# Altium footprint library 13-IC Packages-1bga.PcbLib: 97 footprints (part 5 of 14) (continued)
## BGA376C100P22X22_2300X2300X248 [mm] "BGA 1mm Pitch, Square, 376 pin, 22 Columns x 22 Rows, 23.0mm x 23.0mm" (continued)
  round 1 smd paste-0.51 mask+0.5: FTG1(-13.5,-13.5) FTG2(13.5,13.5)
Top Layer keep-out:
  circle w0.1: c13.5,13.5 r1
  circle w0.1: c-13.5,-13.5 r1
Top Overlay:
  circle w0.25: c-12.125,11.5 r0.125
  region: -10.5,11.5 -11.5,10.5 -11.5,11.5
  lines w0.2: -11.5,10.5 -10.5,11.5 ; -11.5,-11.5 -11.5,11.5 11.5,11.5 11.5,-11.5 -11.5,-11.5
Mechanical 14:
  circle w0.25: c-12.125,11.5 r0.125
  region: -10.5,11.5 -11.5,10.5 -11.5,11.5
  lines w0.1: -11.5,-11.5 11.5,-11.5 11.5,11.5 -11.5,11.5 -11.5,-11.5
  text "AB" at -12.9,-10.8 h0.6
  text "AA" at -12.9,-9.8 h0.6
  text "Y" at -12.4,-8.8 h0.6
  text "W" at -12.4,-7.8 h0.6
  text "V" at -12.4,-6.8 h0.6
  text "U" at -12.4,-5.8 h0.6
  text "T" at -12.4,-4.8 h0.6
  text "R" at -12.4,-3.8 h0.6
  text "P" at -12.4,-2.8 h0.6
  text "N" at -12.4,-1.8 h0.6
  text "M" at -12.4,-0.8 h0.6
  text "L" at -12.4,0.2 h0.6
  text "K" at -12.4,1.2 h0.6
  text "J" at -12.4,2.2 h0.6
  text "H" at -12.4,3.2 h0.6
  text "G" at -12.4,4.2 h0.6
  text "F" at -12.4,5.2 h0.6
  text "E" at -12.4,6.2 h0.6
  text "D" at -12.4,7.2 h0.6
  text "C" at -12.4,8.2 h0.6
  text "B" at -12.4,9.2 h0.6
  text "A" at -12.4,10.2 h0.6
  text "2" at -9.25,12 h0.6
  text "3" at -8.25,12 h0.6
  text "4" at -7.25,12 h0.6
  text "5" at -6.25,12 h0.6
  text "16" at 4.75,12 h0.6
  text "15" at 3.75,12 h0.6
  text "14" at 2.75,12 h0.6
  text "13" at 1.75,12 h0.6
  text "12" at 0.75,12 h0.6
  text "11" at -0.25,12 h0.6
  text "10" at -1.25,12 h0.6
  text "9" at -2.25,12 h0.6
  text "8" at -3.25,12 h0.6
  text "7" at -4.25,12 h0.6
  text "6" at -5.25,12 h0.6
  text "1" at -10.25,12 h0.6
  text "18" at 6.75,12 h0.6
  text "19" at 7.75,12 h0.6
  text "20" at 8.75,12 h0.6
  text "21" at 9.75,12 h0.6
  text "22" at 10.7,12 h0.6
  text "17" at 5.75,12 h0.6
Mechanical 15:
  lines w0.05: -0.5,0 0.5,0 ; 0,-0.5 0,0.5 ; -13.5,-13.5 -13.5,13.5 13.5,13.5 13.5,-13.5 -13.5,-13.5
3D body "BGA376C100P22X22_2300X2300X248.stp": height 2.48, standoff 0, extent -11.6,-11.6 11.6,11.6

## BGA400C100P20X20_2100X2100X243 [mm] "BGA, 1.00mm pitch, square, 400 pin, 20 columns X 20 rows,21.00mm X 21.00mm X 2.43mm H, IPC Medium Density"
height 2.43
pads (402):
  round 0.5 smd: A1(-9.5,9.5) A2(-8.5,9.5) A3(-7.5,9.5) A4(-6.5,9.5) A5(-5.5,9.5) A6(-4.5,9.5) A7(-3.5,9.5) A8(-2.5,9.5) A9(-1.5,9.5) A10(-0.5,9.5) A11(0.5,9.5) A12(1.5,9.5) A13(2.5,9.5) A14(3.5,9.5) A15(4.5,9.5) A16(5.5,9.5) A17(6.5,9.5) A18(7.5,9.5) A19(8.5,9.5) A20(9.5,9.5) B1(-9.5,8.5) B2(-8.5,8.5) B3(-7.5,8.5) B4(-6.5,8.5) B5(-5.5,8.5) B6(-4.5,8.5) B7(-3.5,8.5) B8(-2.5,8.5) B9(-1.5,8.5) B10(-0.5,8.5) B11(0.5,8.5) B12(1.5,8.5) B13(2.5,8.5) B14(3.5,8.5) B15(4.5,8.5) B16(5.5,8.5) B17(6.5,8.5) B18(7.5,8.5) B19(8.5,8.5) B20(9.5,8.5) C1(-9.5,7.5) C2(-8.5,7.5) C3(-7.5,7.5) C4(-6.5,7.5) C5(-5.5,7.5) C6(-4.5,7.5) C7(-3.5,7.5) C8(-2.5,7.5) C9(-1.5,7.5) C10(-0.5,7.5) C11(0.5,7.5) C12(1.5,7.5) C13(2.5,7.5) C14(3.5,7.5) C15(4.5,7.5) C16(5.5,7.5) C17(6.5,7.5) C18(7.5,7.5) C19(8.5,7.5) C20(9.5,7.5) D1(-9.5,6.5) D2(-8.5,6.5) D3(-7.5,6.5) D4(-6.5,6.5) D5(-5.5,6.5) D6(-4.5,6.5) D7(-3.5,6.5) D8(-2.5,6.5) D9(-1.5,6.5) D10(-0.5,6.5) D11(0.5,6.5) D12(1.5,6.5) D13(2.5,6.5) D14(3.5,6.5) D15(4.5,6.5) D16(5.5,6.5) D17(6.5,6.5) D18(7.5,6.5) D19(8.5,6.5) D20(9.5,6.5) E1(-9.5,5.5) E2(-8.5,5.5) E3(-7.5,5.5) E4(-6.5,5.5) E5(-5.5,5.5) E6(-4.5,5.5) E7(-3.5,5.5) E8(-2.5,5.5) E9(-1.5,5.5) E10(-0.5,5.5) E11(0.5,5.5) E12(1.5,5.5) E13(2.5,5.5) E14(3.5,5.5) E15(4.5,5.5) E16(5.5,5.5) E17(6.5,5.5) E18(7.5,5.5) E19(8.5,5.5) E20(9.5,5.5) F1(-9.5,4.5) F2(-8.5,4.5) F3(-7.5,4.5) F4(-6.5,4.5) F5(-5.5,4.5) F6(-4.5,4.5) F7(-3.5,4.5) F8(-2.5,4.5) F9(-1.5,4.5) F10(-0.5,4.5) F11(0.5,4.5) F12(1.5,4.5) F13(2.5,4.5) F14(3.5,4.5) F15(4.5,4.5) F16(5.5,4.5) F17(6.5,4.5) F18(7.5,4.5) F19(8.5,4.5) F20(9.5,4.5) G1(-9.5,3.5) G2(-8.5,3.5) G3(-7.5,3.5) G4(-6.5,3.5) G5(-5.5,3.5) G6(-4.5,3.5) G7(-3.5,3.5) G8(-2.5,3.5) G9(-1.5,3.5) G10(-0.5,3.5) G11(0.5,3.5) G12(1.5,3.5) G13(2.5,3.5) G14(3.5,3.5) G15(4.5,3.5) G16(5.5,3.5) G17(6.5,3.5) G18(7.5,3.5) G19(8.5,3.5) G20(9.5,3.5) H1(-9.5,2.5) H2(-8.5,2.5) H3(-7.5,2.5) H4(-6.5,2.5) H5(-5.5,2.5) H6(-4.5,2.5) H7(-3.5,2.5) H8(-2.5,2.5) H9(-1.5,2.5) H10(-0.5,2.5) H11(0.5,2.5) H12(1.5,2.5) H13(2.5,2.5) H14(3.5,2.5) H15(4.5,2.5) H16(5.5,2.5) H17(6.5,2.5) H18(7.5,2.5) H19(8.5,2.5) H20(9.5,2.5) J1(-9.5,1.5) J2(-8.5,1.5) J3(-7.5,1.5) J4(-6.5,1.5) J5(-5.5,1.5) J6(-4.5,1.5) J7(-3.5,1.5) J8(-2.5,1.5) J9(-1.5,1.5) J10(-0.5,1.5) J11(0.5,1.5) J12(1.5,1.5) J13(2.5,1.5) J14(3.5,1.5) J15(4.5,1.5) J16(5.5,1.5) J17(6.5,1.5) J18(7.5,1.5) J19(8.5,1.5) J20(9.5,1.5) K1(-9.5,0.5) K2(-8.5,0.5) K3(-7.5,0.5) K4(-6.5,0.5) K5(-5.5,0.5) K6(-4.5,0.5) K7(-3.5,0.5) K8(-2.5,0.5) K9(-1.5,0.5) K10(-0.5,0.5) K11(0.5,0.5) K12(1.5,0.5) K13(2.5,0.5) K14(3.5,0.5) K15(4.5,0.5) K16(5.5,0.5) K17(6.5,0.5) K18(7.5,0.5) K19(8.5,0.5) K20(9.5,0.5) L1(-9.5,-0.5) L2(-8.5,-0.5) L3(-7.5,-0.5) L4(-6.5,-0.5) L5(-5.5,-0.5) L6(-4.5,-0.5) L7(-3.5,-0.5) L8(-2.5,-0.5) L9(-1.5,-0.5) L10(-0.5,-0.5) L11(0.5,-0.5) L12(1.5,-0.5) L13(2.5,-0.5) L14(3.5,-0.5) L15(4.5,-0.5) L16(5.5,-0.5) L17(6.5,-0.5) L18(7.5,-0.5) L19(8.5,-0.5) L20(9.5,-0.5) M1(-9.5,-1.5) M2(-8.5,-1.5) M3(-7.5,-1.5) M4(-6.5,-1.5) M5(-5.5,-1.5) M6(-4.5,-1.5) M7(-3.5,-1.5) M8(-2.5,-1.5) M9(-1.5,-1.5) M10(-0.5,-1.5) M11(0.5,-1.5) M12(1.5,-1.5) M13(2.5,-1.5) M14(3.5,-1.5) M15(4.5,-1.5) M16(5.5,-1.5) M17(6.5,-1.5) M18(7.5,-1.5) M19(8.5,-1.5) M20(9.5,-1.5) N1(-9.5,-2.5) N2(-8.5,-2.5) N3(-7.5,-2.5) N4(-6.5,-2.5) N5(-5.5,-2.5) N6(-4.5,-2.5) N7(-3.5,-2.5) N8(-2.5,-2.5) N9(-1.5,-2.5) N10(-0.5,-2.5) N11(0.5,-2.5) N12(1.5,-2.5) N13(2.5,-2.5) N14(3.5,-2.5) N15(4.5,-2.5) N16(5.5,-2.5) N17(6.5,-2.5) N18(7.5,-2.5) N19(8.5,-2.5) N20(9.5,-2.5) P1(-9.5,-3.5) P2(-8.5,-3.5) P3(-7.5,-3.5) P4(-6.5,-3.5) P5(-5.5,-3.5) P6(-4.5,-3.5) P7(-3.5,-3.5) P8(-2.5,-3.5) P9(-1.5,-3.5) P10(-0.5,-3.5) P11(0.5,-3.5) P12(1.5,-3.5) P13(2.5,-3.5) P14(3.5,-3.5) P15(4.5,-3.5) P16(5.5,-3.5) P17(6.5,-3.5) P18(7.5,-3.5) P19(8.5,-3.5) P20(9.5,-3.5) R1(-9.5,-4.5) R2(-8.5,-4.5) R3(-7.5,-4.5) R4(-6.5,-4.5) R5(-5.5,-4.5) R6(-4.5,-4.5) R7(-3.5,-4.5) R8(-2.5,-4.5) R9(-1.5,-4.5) R10(-0.5,-4.5) R11(0.5,-4.5) R12(1.5,-4.5) R13(2.5,-4.5) R14(3.5,-4.5) R15(4.5,-4.5) R16(5.5,-4.5) R17(6.5,-4.5) R18(7.5,-4.5) R19(8.5,-4.5) R20(9.5,-4.5) T1(-9.5,-5.5) T2(-8.5,-5.5) T3(-7.5,-5.5) T4(-6.5,-5.5) T5(-5.5,-5.5) T6(-4.5,-5.5) T7(-3.5,-5.5) T8(-2.5,-5.5) T9(-1.5,-5.5) T10(-0.5,-5.5) T11(0.5,-5.5) T12(1.5,-5.5) T13(2.5,-5.5) T14(3.5,-5.5) T15(4.5,-5.5) T16(5.5,-5.5) T17(6.5,-5.5) T18(7.5,-5.5) T19(8.5,-5.5) T20(9.5,-5.5) U1(-9.5,-6.5) U2(-8.5,-6.5) U3(-7.5,-6.5) U4(-6.5,-6.5) U5(-5.5,-6.5) U6(-4.5,-6.5) U7(-3.5,-6.5) U8(-2.5,-6.5) U9(-1.5,-6.5) U10(-0.5,-6.5) U11(0.5,-6.5) U12(1.5,-6.5) U13(2.5,-6.5) U14(3.5,-6.5) U15(4.5,-6.5) U16(5.5,-6.5) U17(6.5,-6.5) U18(7.5,-6.5) U19(8.5,-6.5) U20(9.5,-6.5) V1(-9.5,-7.5) V2(-8.5,-7.5) V3(-7.5,-7.5) V4(-6.5,-7.5) V5(-5.5,-7.5) V6(-4.5,-7.5) V7(-3.5,-7.5) V8(-2.5,-7.5) V9(-1.5,-7.5) V10(-0.5,-7.5) V11(0.5,-7.5) V12(1.5,-7.5) V13(2.5,-7.5) V14(3.5,-7.5) V15(4.5,-7.5) V16(5.5,-7.5) V17(6.5,-7.5) V18(7.5,-7.5) V19(8.5,-7.5) V20(9.5,-7.5) W1(-9.5,-8.5) W2(-8.5,-8.5) W3(-7.5,-8.5) W4(-6.5,-8.5) W5(-5.5,-8.5) W6(-4.5,-8.5) W7(-3.5,-8.5) W8(-2.5,-8.5) W9(-1.5,-8.5) W10(-0.5,-8.5) W11(0.5,-8.5) W12(1.5,-8.5) W13(2.5,-8.5) W14(3.5,-8.5) W15(4.5,-8.5) W16(5.5,-8.5) W17(6.5,-8.5) W18(7.5,-8.5) W19(8.5,-8.5) W20(9.5,-8.5) Y1(-9.5,-9.5) Y2(-8.5,-9.5) Y3(-7.5,-9.5) Y4(-6.5,-9.5) Y5(-5.5,-9.5) Y6(-4.5,-9.5) Y7(-3.5,-9.5) Y8(-2.5,-9.5) Y9(-1.5,-9.5) Y10(-0.5,-9.5) Y11(0.5,-9.5) Y12(1.5,-9.5) Y13(2.5,-9.5) Y14(3.5,-9.5) Y15(4.5,-9.5) Y16(5.5,-9.5) Y17(6.5,-9.5) Y18(7.5,-9.5) Y19(8.5,-9.5) Y20(9.5,-9.5)
  round 1 smd paste-0.51 mask+0.5: FTG1(-11.35,-11.35) FTG2(11.35,11.35)
Top Layer keep-out:
  circle w0.1: c11.35,11.35 r1
  circle w0.1: c-11.35,-11.35 r1
Top Overlay:
  circle w0.25: c-11.1,9.5 r0.125
  lines w0.2: -10.5,9.5 -9.5,10.5 ; -10.5,9.7 -9.7,10.5 ; -10.5,9.9 -9.9,10.5 ; -10.5,10.1 -10.1,10.5 ; -10.5,10.3 -10.3,10.5 ; -10.5,-10.5 -10.5,10.5 10.5,10.5 10.5,-10.5 -10.5,-10.5
Mechanical 14:
  lines w0.1: -10.5,9.5 -9.5,10.5 ; -10.5,9.6 -9.6,10.5 ; -10.5,9.7 -9.7,10.5 ; -10.5,9.8 -9.8,10.5 ; -10.5,9.9 -9.9,10.5 ; -10.5,10 -10,10.5 ; -10.5,10.1 -10.1,10.5 ; -10.5,10.2 -10.2,10.5 ; -10.5,10.3 -10.3,10.5 ; -10.5,10.4 -10.4,10.5 ; -10.5,-10.5 -10.5,10.5 10.5,10.5 10.5,-10.5 -10.5,-10.5
  text "A" at -11.4,9.2 h0.6
  text "2" at -8.25,11 h0.6
  text "3" at -7.25,11 h0.6
  text "4" at -6.25,11 h0.6
  text "5" at -5.25,11 h0.6
  text "16" at 5.75,11 h0.6
  text "15" at 4.75,11 h0.6
  text "14" at 3.75,11 h0.6
  text "13" at 2.75,11 h0.6
  text "12" at 1.75,11 h0.6
  text "11" at 0.75,11 h0.6
  text "10" at -0.25,11 h0.6
  text "9" at -1.25,11 h0.6
  text "8" at -2.25,11 h0.6
  text "7" at -3.25,11 h0.6
  text "6" at -4.25,11 h0.6
  text "1" at -9.25,11 h0.6
  text "18" at 7.75,11 h0.6
  text "19" at 8.75,11 h0.6
  text "20" at 9.75,11 h0.6
  text "17" at 6.75,11 h0.6
  text "Y" at -11.4,-9.8 h0.6
  text "W" at -11.4,-8.8 h0.6
  text "V" at -11.4,-7.8 h0.6
  text "U" at -11.4,-6.8 h0.6
  text "T" at -11.4,-5.8 h0.6
  text "R" at -11.4,-4.8 h0.6
  text "P" at -11.4,-3.8 h0.6
  text "N" at -11.4,-2.8 h0.6
  text "M" at -11.4,-1.8 h0.6
  text "L" at -11.4,-0.8 h0.6
  text "K" at -11.4,0.2 h0.6
  text "J" at -11.4,1.2 h0.6
  text "H" at -11.4,2.2 h0.6
  text "G" at -11.4,3.2 h0.6
  text "F" at -11.4,4.2 h0.6
  text "E" at -11.4,5.2 h0.6
  text "D" at -11.4,6.2 h0.6
  text "C" at -11.4,7.2 h0.6
  text "B" at -11.4,8.2 h0.6
Mechanical 15:
  circle w0.05: c0,0 r0.35
  lines w0.05: -0.5,0 0.5,0 ; 0,-0.5 0,0.5 ; -12.5,-12.5 -12.5,12.5 12.5,12.5 12.5,-12.5 -12.5,-12.5
3D body "BGA400C100P20X20_2100X2100X243.stp": height 2.43, standoff 0, extent -10.5,-10.5 10.5,10.5

## BGA400X20 [mm]
height 23.14
pads (225):
  round 0.305 smd: A1(-6.175,-4.225) A2(-6.175,-3.575) A3(-6.175,-2.925) A4(-6.175,-2.275) A11(-6.175,2.275) A12(-6.175,2.925) A13(-6.175,3.575) A14(-6.175,4.225) B1(-5.525,-4.225) B2(-5.525,-3.575) B3(-5.525,-2.925) B4(-5.525,-2.275) B11(-5.525,2.275) B12(-5.525,2.925) B13(-5.525,3.575) B14(-5.525,4.225) C1(-4.875,-4.225) C2(-4.875,-3.575) C3(-4.875,-2.925) C4(-4.875,-2.275) C5(-4.875,-1.625) C7(-4.875,-0.325) C8(-4.875,0.325) C9(-4.875,0.975) C10(-4.875,1.625) C11(-4.875,2.275) C12(-4.875,2.925) C13(-4.875,3.575) C14(-4.875,4.225) D1(-4.225,-4.225) D2(-4.225,-3.575) D3(-4.225,-2.925) D4(-4.225,-2.275) D5(-4.225,-1.625) D6(-4.225,-0.975) D7(-4.225,-0.325) D8(-4.225,0.325) D9(-4.225,0.975) D10(-4.225,1.625) D11(-4.225,2.275) D12(-4.225,2.925) D13(-4.225,3.575) D14(-4.225,4.225) E1(-3.575,-4.225) E2(-3.575,-3.575) E3(-3.575,-2.925) E4(-3.575,-2.275) E5(-3.575,-1.625) E6(-3.575,-0.975) E7(-3.575,-0.325) E8(-3.575,0.325) E9(-3.575,0.975) E10(-3.575,1.625) E11(-3.575,2.275) E12(-3.575,2.925) E13(-3.575,3.575) F2(-2.925,-3.575) F3(-2.925,-2.925) F4(-2.925,-2.275) F5(-2.925,-1.625) F6(-2.925,-0.975) F8(-2.925,0.325) F9(-2.925,0.975) F10(-2.925,1.625) F11(-2.925,2.275) F12(-2.925,2.925) F13(-2.925,3.575) G3(-2.275,-2.925) G4(-2.275,-2.275) G5(-2.275,-1.625) G6(-2.275,-0.975) G7(-2.275,-0.325) G8(-2.275,0.325) G9(-2.275,0.975) G10(-2.275,1.625) G11(-2.275,2.275) G12(-2.275,2.925) H2(-1.625,-3.575) H3(-1.625,-2.925) H4(-1.625,-2.275) H5(-1.625,-1.625) H6(-1.625,-0.975) H9(-1.625,0.975) H10(-1.625,1.625) H11(-1.625,2.275) H12(-1.625,2.925) H13(-1.625,3.575) J2(-0.975,-3.575) J3(-0.975,-2.925) J4(-0.975,-2.275) J5(-0.975,-1.625) J6(-0.975,-0.975) J9(-0.975,0.975) J10(-0.975,1.625) J11(-0.975,2.275) J12(-0.975,2.925) J13(-0.975,3.575) K1(-0.325,-4.225) K2(-0.325,-3.575) K3(-0.325,-2.925) K4(-0.325,-2.275) K5(-0.325,-1.625) K6(-0.325,-0.975) K9(-0.325,0.975) K10(-0.325,1.625) K11(-0.325,2.275) K12(-0.325,2.925) K13(-0.325,3.575) K14(-0.325,4.225) L1(0.325,-4.225) L2(0.325,-3.575) L3(0.325,-2.925) L4(0.325,-2.275) L5(0.325,-1.625) L6(0.325,-0.975) L9(0.325,0.975) L10(0.325,1.625) L11(0.325,2.275) L12(0.325,2.925) L14(0.325,4.225) M2(0.975,-3.575) M3(0.975,-2.925) M4(0.975,-2.275) M5(0.975,-1.625) M6(0.975,-0.975) M9(0.975,0.975) M10(0.975,1.625) M11(0.975,2.275) M12(0.975,2.925) M13(0.975,3.575) N2(1.625,-3.575) N3(1.625,-2.925) N4(1.625,-2.275) N5(1.625,-1.625) N6(1.625,-0.975) N9(1.625,0.975) N10(1.625,1.625) N11(1.625,2.275) N12(1.625,2.925) N13(1.625,3.575) P3(2.275,-2.925) P4(2.275,-2.275) P5(2.275,-1.625) P6(2.275,-0.975) P7(2.275,-0.325) P8(2.275,0.325) P9(2.275,0.975) P10(2.275,1.625) P11(2.275,2.275) P12(2.275,2.925) R2(2.925,-3.575) R3(2.925,-2.925) R4(2.925,-2.275) R5(2.925,-1.625) R6(2.925,-0.975) R7(2.925,-0.325) R9(2.925,0.975) R10(2.925,1.625) R11(2.925,2.275) R12(2.925,2.925) R13(2.925,3.575) T2(3.575,-3.575) T3(3.575,-2.925) T4(3.575,-2.275) T5(3.575,-1.625) T6(3.575,-0.975) T7(3.575,-0.325) T8(3.575,0.325) T9(3.575,0.975) T10(3.575,1.625) T11(3.575,2.275) T12(3.575,2.925) T13(3.575,3.575) U1(4.225,-4.225) U3(4.225,-2.925) U4(4.225,-2.275) U5(4.225,-1.625) U7(4.225,-0.325) U8(4.225,0.325) U9(4.225,0.975) U11(4.225,2.275) U12(4.225,2.925) U14(4.225,4.225) V1(4.875,-4.225) V2(4.875,-3.575) V3(4.875,-2.925) V4(4.875,-2.275) V5(4.875,-1.625) V6(4.875,-0.975) V7(4.875,-0.325) V8(4.875,0.325) V9(4.875,0.975) V10(4.875,1.625) V11(4.875,2.275) V12(4.875,2.925) V13(4.875,3.575) V14(4.875,4.225) W1(5.525,-4.225) W2(5.525,-3.575) W3(5.525,-2.925) W4(5.525,-2.275) W11(5.525,2.275) W12(5.525,2.925) W13(5.525,3.575) W14(5.525,4.225) Y1(6.175,-4.225) Y2(6.175,-3.575) Y3(6.175,-2.925) Y4(6.175,-2.275) Y11(6.175,2.275) Y12(6.175,2.925) Y13(6.175,3.575) Y14(6.175,4.225)
  round 0.305 smd mask+0: C6(-4.875,-0.975) F7(-2.925,-0.325) G2(-2.275,-3.575) G13(-2.275,3.575) L13(0.325,3.575) P2(2.275,-3.575) P13(2.275,3.575) R8(2.925,0.325) U2(4.225,-3.575) U6(4.225,-0.975) U10(4.225,1.625) U13(4.225,3.575)
Top Overlay:
  lines w0.203: -7.064,-4.327 -5.759,-5.632 ; -7.089,-5.639 -7.089,5.613 6.881,5.613 6.881,-5.639 -7.089,-5.639
3D body "bga800x20.stp": height 0.78, standoff 0, extent -6.894,-5.45 6.706,5.45

## BGA456C100P22X22_2300X2300X260 [mm] "BGA, 1.00mm pitch, Square; 456 pin, 22 columns X 22 rows, 23.00mm X 23.00mm X 2.60mm H"
height 2.6
pads (458):
  round 0.5 smd: A1(-10.5,10.5) A2(-9.5,10.5) A3(-8.5,10.5) A4(-7.5,10.5) A5(-6.5,10.5) A6(-5.5,10.5) A7(-4.5,10.5) A8(-3.5,10.5) A9(-2.5,10.5) A10(-1.5,10.5) A11(-0.5,10.5) A12(0.5,10.5) A13(1.5,10.5) A14(2.5,10.5) A15(3.5,10.5) A16(4.5,10.5) A17(5.5,10.5) A18(6.5,10.5) A19(7.5,10.5) A20(8.5,10.5) A21(9.5,10.5) A22(10.5,10.5) AA1(-10.5,-9.5) AA2(-9.5,-9.5) AA3(-8.5,-9.5) AA4(-7.5,-9.5) AA5(-6.5,-9.5) AA6(-5.5,-9.5) AA7(-4.5,-9.5) AA8(-3.5,-9.5) AA9(-2.5,-9.5) AA10(-1.5,-9.5) AA11(-0.5,-9.5) AA12(0.5,-9.5) AA13(1.5,-9.5) AA14(2.5,-9.5) AA15(3.5,-9.5) AA16(4.5,-9.5) AA17(5.5,-9.5) AA18(6.5,-9.5) AA19(7.5,-9.5) AA20(8.5,-9.5) AA21(9.5,-9.5) AA22(10.5,-9.5) AB1(-10.5,-10.5) AB2(-9.5,-10.5) AB3(-8.5,-10.5) AB4(-7.5,-10.5) AB5(-6.5,-10.5) AB6(-5.5,-10.5) AB7(-4.5,-10.5) AB8(-3.5,-10.5) AB9(-2.5,-10.5) AB10(-1.5,-10.5) AB11(-0.5,-10.5) AB12(0.5,-10.5) AB13(1.5,-10.5) AB14(2.5,-10.5) AB15(3.5,-10.5) AB16(4.5,-10.5) AB17(5.5,-10.5) AB18(6.5,-10.5) AB19(7.5,-10.5) AB20(8.5,-10.5) AB21(9.5,-10.5) AB22(10.5,-10.5) B1(-10.5,9.5) B2(-9.5,9.5) B3(-8.5,9.5) B4(-7.5,9.5) B5(-6.5,9.5) B6(-5.5,9.5) B7(-4.5,9.5) B8(-3.5,9.5) B9(-2.5,9.5) B10(-1.5,9.5) B11(-0.5,9.5) B12(0.5,9.5) B13(1.5,9.5) B14(2.5,9.5) B15(3.5,9.5) B16(4.5,9.5) B17(5.5,9.5) B18(6.5,9.5) B19(7.5,9.5) B20(8.5,9.5) B21(9.5,9.5) B22(10.5,9.5) C1(-10.5,8.5) C2(-9.5,8.5) C3(-8.5,8.5) C4(-7.5,8.5) C5(-6.5,8.5) C6(-5.5,8.5) C7(-4.5,8.5) C8(-3.5,8.5) C9(-2.5,8.5) C10(-1.5,8.5) C11(-0.5,8.5) C12(0.5,8.5) C13(1.5,8.5) C14(2.5,8.5) C15(3.5,8.5) C16(4.5,8.5) C17(5.5,8.5) C18(6.5,8.5) C19(7.5,8.5) C20(8.5,8.5) C21(9.5,8.5) C22(10.5,8.5) D1(-10.5,7.5) D2(-9.5,7.5) D3(-8.5,7.5) D4(-7.5,7.5) D5(-6.5,7.5) D6(-5.5,7.5) D7(-4.5,7.5) D8(-3.5,7.5) D9(-2.5,7.5) D10(-1.5,7.5) D11(-0.5,7.5) D12(0.5,7.5) D13(1.5,7.5) D14(2.5,7.5) D15(3.5,7.5) D16(4.5,7.5) D17(5.5,7.5) D18(6.5,7.5) D19(7.5,7.5) D20(8.5,7.5) D21(9.5,7.5) D22(10.5,7.5) E1(-10.5,6.5) E2(-9.5,6.5) E3(-8.5,6.5) E4(-7.5,6.5) E5(-6.5,6.5) E6(-5.5,6.5) E7(-4.5,6.5) E8(-3.5,6.5) E9(-2.5,6.5) E10(-1.5,6.5) E11(-0.5,6.5) E12(0.5,6.5) E13(1.5,6.5) E14(2.5,6.5) E15(3.5,6.5) E16(4.5,6.5) E17(5.5,6.5) E18(6.5,6.5) E19(7.5,6.5) E20(8.5,6.5) E21(9.5,6.5) E22(10.5,6.5) F1(-10.5,5.5) F2(-9.5,5.5) F3(-8.5,5.5) F4(-7.5,5.5) F5(-6.5,5.5) F6(-5.5,5.5) F7(-4.5,5.5) F8(-3.5,5.5) F9(-2.5,5.5) F10(-1.5,5.5) F11(-0.5,5.5) F12(0.5,5.5) F13(1.5,5.5) F14(2.5,5.5) F15(3.5,5.5) F16(4.5,5.5) F17(5.5,5.5) F18(6.5,5.5) F19(7.5,5.5) F20(8.5,5.5) F21(9.5,5.5) F22(10.5,5.5) G1(-10.5,4.5) G2(-9.5,4.5) G3(-8.5,4.5) G4(-7.5,4.5) G5(-6.5,4.5) G6(-5.5,4.5) G7(-4.5,4.5) G8(-3.5,4.5) G9(-2.5,4.5) G10(-1.5,4.5) G11(-0.5,4.5) G12(0.5,4.5) G13(1.5,4.5) G14(2.5,4.5) G15(3.5,4.5) G16(4.5,4.5) G17(5.5,4.5) G18(6.5,4.5) G19(7.5,4.5) G20(8.5,4.5) G21(9.5,4.5) G22(10.5,4.5) H1(-10.5,3.5) H2(-9.5,3.5) H3(-8.5,3.5) H4(-7.5,3.5) H5(-6.5,3.5) H6(-5.5,3.5) H7(-4.5,3.5) H16(4.5,3.5) H17(5.5,3.5) H18(6.5,3.5) H19(7.5,3.5) H20(8.5,3.5) H21(9.5,3.5) H22(10.5,3.5) J1(-10.5,2.5) J2(-9.5,2.5) J3(-8.5,2.5) J4(-7.5,2.5) J5(-6.5,2.5) J6(-5.5,2.5) J7(-4.5,2.5) J9(-2.5,2.5) J10(-1.5,2.5) J11(-0.5,2.5) J12(0.5,2.5) J13(1.5,2.5) J14(2.5,2.5) J16(4.5,2.5) J17(5.5,2.5) J18(6.5,2.5) J19(7.5,2.5) J20(8.5,2.5) J21(9.5,2.5) J22(10.5,2.5) K1(-10.5,1.5) K2(-9.5,1.5) K3(-8.5,1.5) K4(-7.5,1.5) K5(-6.5,1.5) K6(-5.5,1.5) K7(-4.5,1.5) K9(-2.5,1.5) K10(-1.5,1.5) K11(-0.5,1.5) K12(0.5,1.5) K13(1.5,1.5) K14(2.5,1.5) K16(4.5,1.5) K17(5.5,1.5) K18(6.5,1.5) K19(7.5,1.5) K20(8.5,1.5) K21(9.5,1.5) K22(10.5,1.5) L1(-10.5,0.5) L2(-9.5,0.5) L3(-8.5,0.5) L4(-7.5,0.5) L5(-6.5,0.5) L6(-5.5,0.5) L7(-4.5,0.5) L9(-2.5,0.5) L10(-1.5,0.5) L11(-0.5,0.5) L12(0.5,0.5) L13(1.5,0.5) L14(2.5,0.5) L16(4.5,0.5) L17(5.5,0.5) L18(6.5,0.5) L19(7.5,0.5) L20(8.5,0.5) L21(9.5,0.5) L22(10.5,0.5) M1(-10.5,-0.5) M2(-9.5,-0.5) M3(-8.5,-0.5) M4(-7.5,-0.5) M5(-6.5,-0.5) M6(-5.5,-0.5) M7(-4.5,-0.5) M9(-2.5,-0.5) M10(-1.5,-0.5) M11(-0.5,-0.5) M12(0.5,-0.5) M13(1.5,-0.5) M14(2.5,-0.5) M16(4.5,-0.5) M17(5.5,-0.5) M18(6.5,-0.5) M19(7.5,-0.5) M20(8.5,-0.5) M21(9.5,-0.5) M22(10.5,-0.5) N1(-10.5,-1.5) N2(-9.5,-1.5) N3(-8.5,-1.5) N4(-7.5,-1.5) N5(-6.5,-1.5) N6(-5.5,-1.5) N7(-4.5,-1.5) N9(-2.5,-1.5) N10(-1.5,-1.5) N11(-0.5,-1.5) N12(0.5,-1.5) N13(1.5,-1.5) N14(2.5,-1.5) N16(4.5,-1.5) N17(5.5,-1.5) N18(6.5,-1.5) N19(7.5,-1.5) N20(8.5,-1.5) N21(9.5,-1.5) N22(10.5,-1.5) P1(-10.5,-2.5) P2(-9.5,-2.5) P3(-8.5,-2.5) P4(-7.5,-2.5) P5(-6.5,-2.5) P6(-5.5,-2.5) P7(-4.5,-2.5) P9(-2.5,-2.5) P10(-1.5,-2.5) P11(-0.5,-2.5) P12(0.5,-2.5) P13(1.5,-2.5) P14(2.5,-2.5) P16(4.5,-2.5) P17(5.5,-2.5) P18(6.5,-2.5) P19(7.5,-2.5) P20(8.5,-2.5) P21(9.5,-2.5) P22(10.5,-2.5) R1(-10.5,-3.5) R2(-9.5,-3.5) R3(-8.5,-3.5) R4(-7.5,-3.5) R5(-6.5,-3.5) R6(-5.5,-3.5) R7(-4.5,-3.5) R16(4.5,-3.5) R17(5.5,-3.5) R18(6.5,-3.5) R19(7.5,-3.5) R20(8.5,-3.5) R21(9.5,-3.5) R22(10.5,-3.5) T1(-10.5,-4.5) T2(-9.5,-4.5) T3(-8.5,-4.5) T4(-7.5,-4.5) T5(-6.5,-4.5) T6(-5.5,-4.5) T7(-4.5,-4.5) T8(-3.5,-4.5) T9(-2.5,-4.5) T10(-1.5,-4.5) T11(-0.5,-4.5) T12(0.5,-4.5) T13(1.5,-4.5) T14(2.5,-4.5) T15(3.5,-4.5) T16(4.5,-4.5) T17(5.5,-4.5) T18(6.5,-4.5) T19(7.5,-4.5) T20(8.5,-4.5) T21(9.5,-4.5) T22(10.5,-4.5) U1(-10.5,-5.5) U2(-9.5,-5.5) U3(-8.5,-5.5) U4(-7.5,-5.5) U5(-6.5,-5.5) U6(-5.5,-5.5) U7(-4.5,-5.5) U8(-3.5,-5.5) U9(-2.5,-5.5) U10(-1.5,-5.5) U11(-0.5,-5.5) U12(0.5,-5.5) U13(1.5,-5.5) U14(2.5,-5.5) U15(3.5,-5.5) U16(4.5,-5.5) U17(5.5,-5.5) U18(6.5,-5.5) U19(7.5,-5.5) U20(8.5,-5.5) U21(9.5,-5.5) U22(10.5,-5.5) V1(-10.5,-6.5) V2(-9.5,-6.5) V3(-8.5,-6.5) V4(-7.5,-6.5) V5(-6.5,-6.5) V6(-5.5,-6.5) V7(-4.5,-6.5) V8(-3.5,-6.5) V9(-2.5,-6.5) V10(-1.5,-6.5) V11(-0.5,-6.5) V12(0.5,-6.5) V13(1.5,-6.5) V14(2.5,-6.5) V15(3.5,-6.5) V16(4.5,-6.5) V17(5.5,-6.5) V18(6.5,-6.5) V19(7.5,-6.5) V20(8.5,-6.5) V21(9.5,-6.5) V22(10.5,-6.5) W1(-10.5,-7.5) W2(-9.5,-7.5) W3(-8.5,-7.5) W4(-7.5,-7.5) W5(-6.5,-7.5) W6(-5.5,-7.5) W7(-4.5,-7.5) W8(-3.5,-7.5) W9(-2.5,-7.5) W10(-1.5,-7.5) W11(-0.5,-7.5) W12(0.5,-7.5) W13(1.5,-7.5) W14(2.5,-7.5) W15(3.5,-7.5) W16(4.5,-7.5) W17(5.5,-7.5) W18(6.5,-7.5) W19(7.5,-7.5) W20(8.5,-7.5) W21(9.5,-7.5) W22(10.5,-7.5) Y1(-10.5,-8.5) Y2(-9.5,-8.5) Y3(-8.5,-8.5) Y4(-7.5,-8.5) Y5(-6.5,-8.5) Y6(-5.5,-8.5) Y7(-4.5,-8.5) Y8(-3.5,-8.5) Y9(-2.5,-8.5) Y10(-1.5,-8.5) Y11(-0.5,-8.5) Y12(0.5,-8.5) Y13(1.5,-8.5) Y14(2.5,-8.5) Y15(3.5,-8.5) Y16(4.5,-8.5) Y17(5.5,-8.5) Y18(6.5,-8.5) Y19(7.5,-8.5) Y20(8.5,-8.5) Y21(9.5,-8.5) Y22(10.5,-8.5)
  round 1 smd paste-0.51 mask+0.5: FTG1(-12.35,-12.35) FTG2(12.35,12.35)
Top Layer keep-out:
  circle w0.1: c12.35,12.35 r1
  circle w0.1: c-12.35,-12.35 r1
Top Overlay:
  circle w0.25: c-12.1,10.5 r0.125
  lines w0.2: -11.5,10.5 -10.5,11.5 ; -11.5,10.7 -10.7,11.5 ; -11.5,10.9 -10.9,11.5 ; -11.5,11.1 -11.1,11.5 ; -11.5,11.3 -11.3,11.5 ; -11.5,-11.5 11.5,-11.5 11.5,11.5 -11.5,11.5 -11.5,-11.5
Mechanical 14:
  lines w0.1: -11.5,10.5 -10.5,11.5 ; -11.5,10.6 -10.6,11.5 ; -11.5,10.7 -10.7,11.5 ; -11.5,10.8 -10.8,11.5 ; -11.5,10.9 -10.9,11.5 ; -11.5,11 -11,11.5 ; -11.5,11.1 -11.1,11.5 ; -11.5,11.2 -11.2,11.5 ; -11.5,11.3 -11.3,11.5 ; -11.5,11.4 -11.4,11.5 ; -11.5,-11.5 11.5,-11.5 11.5,11.5 -11.5,11.5 -11.5,-11.5
  text "AB" at -12.9,-10.8 h0.6
  text "AA" at -12.9,-9.8 h0.6
  text "Y" at -12.4,-8.8 h0.6
  text "W" at -12.4,-7.8 h0.6
  text "V" at -12.4,-6.8 h0.6
  text "U" at -12.4,-5.8 h0.6
  text "T" at -12.4,-4.8 h0.6
  text "R" at -12.4,-3.8 h0.6
  text "P" at -12.4,-2.8 h0.6
  text "N" at -12.4,-1.8 h0.6
  text "M" at -12.4,-0.8 h0.6
  text "L" at -12.4,0.2 h0.6
  text "K" at -12.4,1.2 h0.6
  text "J" at -12.4,2.2 h0.6
  text "H" at -12.4,3.2 h0.6
  text "G" at -12.4,4.2 h0.6
  text "F" at -12.4,5.2 h0.6
  text "E" at -12.4,6.2 h0.6
  text "D" at -12.4,7.2 h0.6
  text "C" at -12.4,8.2 h0.6
  text "B" at -12.4,9.2 h0.6
  text "A" at -12.4,10.2 h0.6
  text "2" at -9.25,12 h0.6
  text "3" at -8.25,12 h0.6
  text "4" at -7.25,12 h0.6
  text "5" at -6.25,12 h0.6
  text "16" at 4.75,12 h0.6
  text "15" at 3.75,12 h0.6
  text "14" at 2.75,12 h0.6
  text "13" at 1.75,12 h0.6
  text "12" at 0.75,12 h0.6
  text "11" at -0.25,12 h0.6
  text "10" at -1.25,12 h0.6
  text "9" at -2.25,12 h0.6
  text "8" at -3.25,12 h0.6
  text "7" at -4.25,12 h0.6
  text "6" at -5.25,12 h0.6
  text "1" at -10.25,12 h0.6
  text "18" at 6.75,12 h0.6
  text "19" at 7.75,12 h0.6
  text "20" at 8.75,12 h0.6
  text "21" at 9.75,12 h0.6
  text "22" at 10.7,12 h0.6
  text "17" at 5.75,12 h0.6
Mechanical 15:
  circle w0.05: c0,0 r0.35
  lines w0.05: -0.5,0 0.5,0 ; 0,-0.5 0,0.5 ; -13.5,-13.5 13.5,-13.5 13.5,13.5 -13.5,13.5 -13.5,-13.5
3D body "BGA456C100P22X22_2300X2300X260.stp": height 2.6, standoff 0, extent -11.5,-11.5 11.5,11.5